# Altium footprint library PcbLib.PcbLib: 141 footprints (part 2 of 9)
Each footprint in its own frame and in the unit in brackets; x right, y up, seen from the top. Pads: shape width x height; smd on the part's side, far side on the other; paste and mask are expansions set on the pad; w line width, h text height; cw(c..) or ccw(c..) is an arc to the next point about the centre after c.
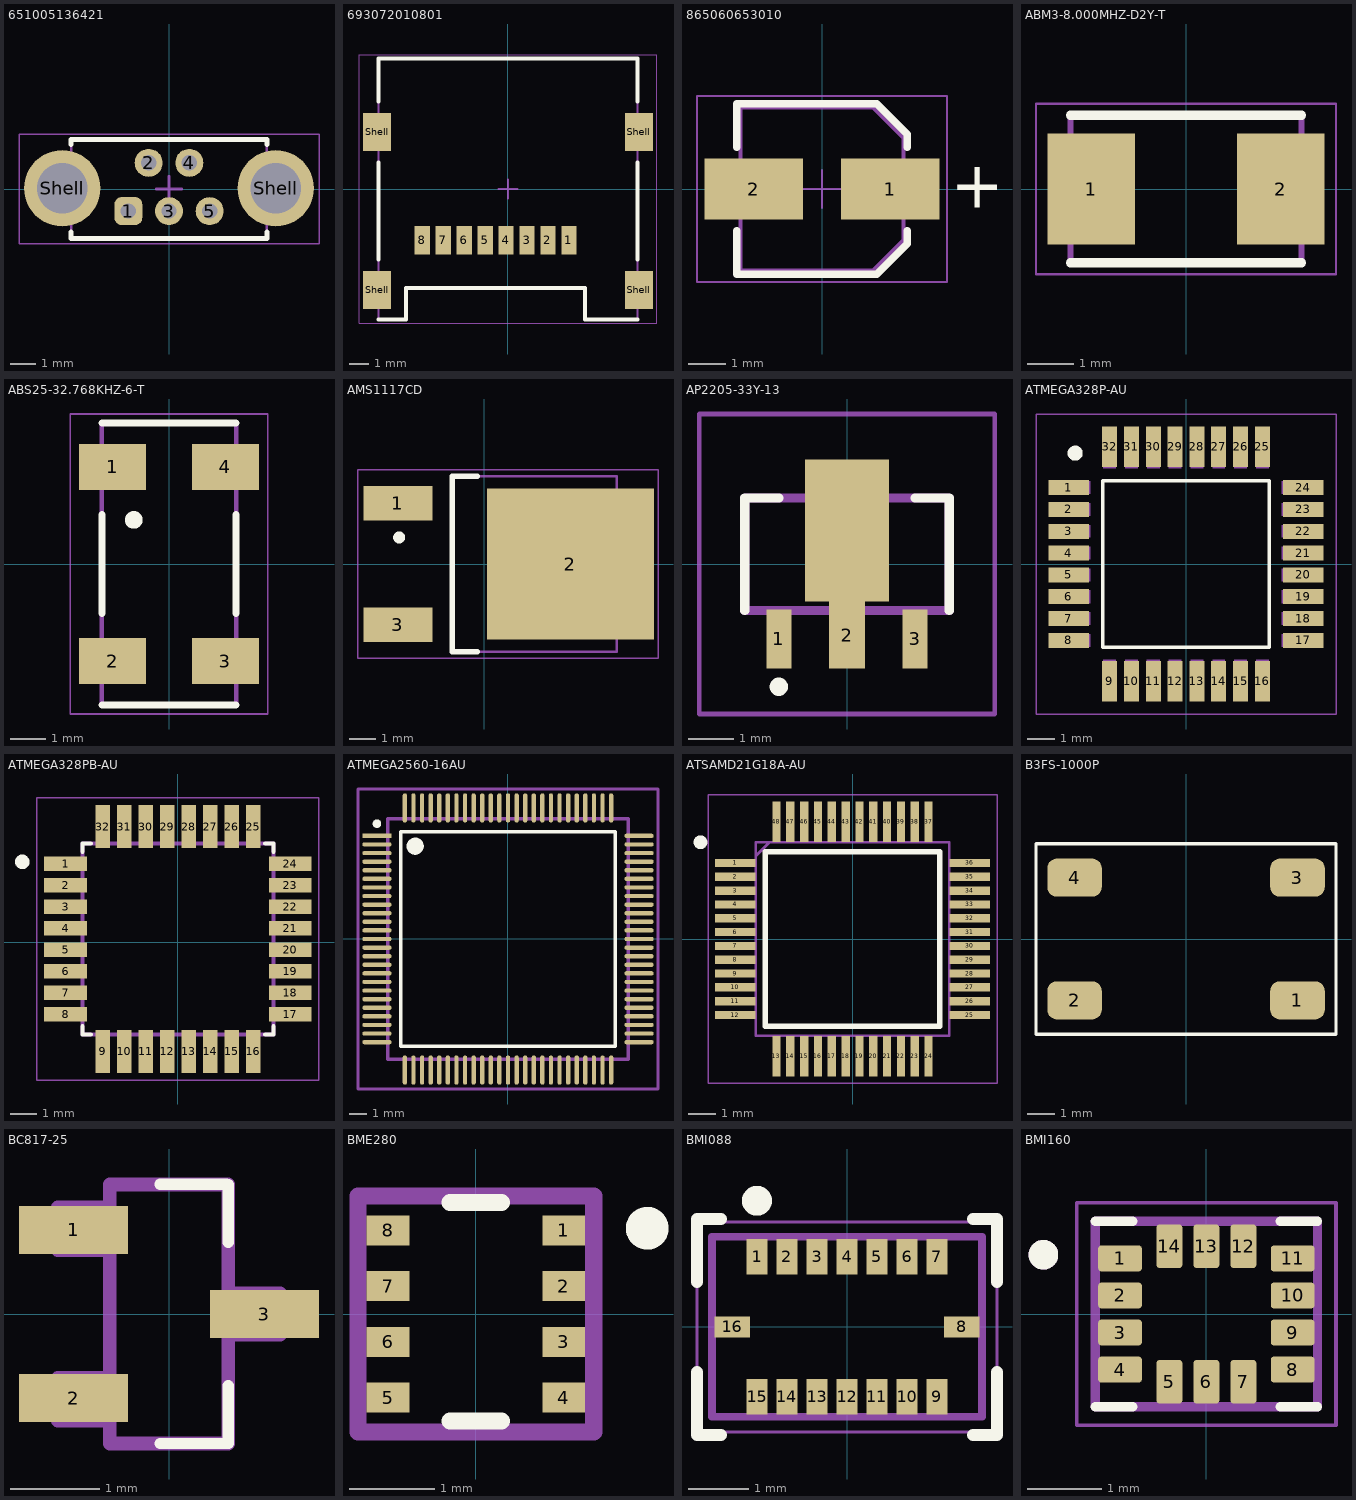
[diagram p1: the footprints below, top view; thin cyan lines are the x and y axes]

## 651005136421 [mm]
pads (7):
  rrect50% 1.1x1.1 hole 0.6: 1(-1.6,-0.87)
  round 1.1 hole 0.6: 2(-0.8,1.03) 3(0,-0.87) 4(0.8,1.03) 5(1.6,-0.87)
  round 3 hole 2: Shell(-4.2,0.03) Shell(4.2,0.03)
Top Overlay:
  lines w0.2: -3.85,-1.7 -3.85,-1.95 3.85,-1.95 3.85,-1.7 ; -3.85,1.75 -3.85,1.95 3.85,1.95 3.85,1.75
Top 3D Body:
  lines w0.1: -3.85,-1.95 -3.85,1.95 3.85,1.95 3.85,-1.95 -3.85,-1.95
Top Designator:
  text ".Designator" at -3.647,-0.357 h1
V Cut:
  lines w0.05: -5.9,-2.15 5.9,-2.15 5.9,2.15 -5.9,2.15 -5.9,-2.15
Top Assembly:
  lines w0.1: -3.85,-1.95 -3.85,1.95 3.85,1.95 3.85,-1.95 -3.85,-1.95
Top Component Center:
  lines w0.1: -0.5,0 0.5,0 ; 0,-0.5 0,0.5
3D body "651005136421.stp": height 9.4, standoff -2.6, extent -5.099,-1.92 5.098,1.98

## 693072010801 [mm]
pads (12):
  rect 0.8x1.5 smd: 1(3.2,-2.7) 2(2.1,-2.7) 3(1,-2.7) 4(-0.1,-2.7) 5(-1.2,-2.7) 6(-2.3,-2.7) 7(-3.4,-2.7) 8(-4.5,-2.7)
  rect 1.45x2 smd: Shell(-6.875,-5.3) Shell(-6.875,3) Shell(6.875,-5.3) Shell(6.875,3)
Top Overlay:
  lines w0.2: -6.8,-6.85 -5.35,-6.85 -5.35,-5.2 4.05,-5.2 4.05,-6.85 6.8,-6.85 ; -6.8,-3.7 -6.8,1.4 ; -6.8,4.6 -6.8,6.85 6.8,6.85 6.8,4.6 ; 6.8,-3.7 6.8,1.4
Top 3D Body:
  lines w0.1: -6.8,-6 -7.25,-6 -7.25,-4.6 -6.8,-4.6 ; -6.8,2.3 -7.25,2.3 -7.25,3.7 -6.8,3.7 ; 6.8,-6 7.25,-6 7.25,-4.6 6.8,-4.6 ; 6.8,2.3 7.25,2.3 7.25,3.7 6.8,3.7 ; -6.8,-6.85 -5.35,-6.85 -5.35,-5.2 4.05,-5.2 4.05,-6.85 6.8,-6.85 6.8,6.85 -6.8,6.85 -6.8,-6.85
Top Designator:
  text ".Designator" at -3.647,-0.357 h1
V Cut:
  lines w0.05: -7.8,-7.05 7.8,-7.05 7.8,7.05 -7.8,7.05 -7.8,-7.05
Top Assembly:
  lines w0.1: -6.8,-6 -7.25,-6 -7.25,-4.6 -6.8,-4.6 ; -6.8,2.3 -7.25,2.3 -7.25,3.7 -6.8,3.7 ; 6.8,-6 7.25,-6 7.25,-4.6 6.8,-4.6 ; 6.8,2.3 7.25,2.3 7.25,3.7 6.8,3.7 ; -6.8,-6.85 -6.8,6.85 6.8,6.85 6.8,-6.85 4.05,-6.85 4.05,-5.2 -5.35,-5.2 -5.35,-6.85 -6.8,-6.85
Top Component Center:
  lines w0.1: -0.5,0 0.5,0 ; 0,-0.5 0,0.5
3D body "693072010801.stp": height 1.79, standoff 0.02, extent -7.25,-6.85 7.25,6.85

## 865060653010 [mm]
pads (2):
  rect 2.6x1.6 smd: 1(1.8,0) 2(-1.8,0)
Top Overlay:
  lines w0.2: -2.25,-1.1 -2.25,-2.25 1.45,-2.25 2.25,-1.45 2.25,-1.1 ; -2.25,1.1 -2.25,2.25 1.45,2.25 2.25,1.45 2.25,1.1
  text "+" at 3.4,-0.5 h1.22
Top Courtyard:
  lines w0.05: -0.5,0 0.5,0 ; 0,-0.5 0,0.5 ; -3.3,-2.45 3.3,-2.45 3.3,2.45 -3.3,2.45 -3.3,-2.45
Top Component Outline:
  lines w0.1: -2.15,-2.15 1.35,-2.15 2.15,-1.35 2.15,1.35 1.35,2.15 -2.15,2.15 -2.15,-2.15
3D body "4x5.5x1.stp": height 5.5, standoff 0, extent -2.5,-2.15 2.5,2.15

## ABM3-8.000MHZ-D2Y-T [mm]
pads (2):
  rect 1.9x2.4 smd: 1(-2.05,0) 2(2.05,0)
Top Overlay:
  lines w0.2: -2.5,-1.6 2.5,-1.6 ; -2.5,1.6 2.5,1.6
Mechanical 13:
  lines w0.127: -2.5,-1.6 2.5,-1.6 2.5,1.6 -2.5,1.6 -2.5,-1.6
Mechanical 15:
  lines w0.05: -3.25,-1.85 3.25,-1.85 3.25,1.85 -3.25,1.85 -3.25,-1.85
3D body "step_temp.STEP": height 1.3, standoff 0, extent -2.5,-1.6 2.5,1.6

## ABS25-32.768KHZ-6-T [mm]
pads (4):
  rect 1.9x1.3 smd: 1(-1.6,2.75) 2(-1.6,-2.75) 3(1.6,-2.75) 4(1.6,2.75)
Top Overlay:
  circle w0.25: c-1,1.25 r0.125
  lines w0.2: -1.9,-4 1.9,-4 ; -1.9,-1.4 -1.9,1.4 ; -1.9,4 1.9,4 ; 1.9,-1.4 1.9,1.4
Mechanical 13:
  lines w0.127: -1.9,-4 1.9,-4 1.9,4 -1.9,4 -1.9,-4
Mechanical 15:
  lines w0.05: -2.8,-4.25 2.8,-4.25 2.8,4.25 -2.8,4.25 -2.8,-4.25
3D body "ABS25-32.768KHZ-6-T.STEP": height 2.75, standoff 0.09, extent -2.029,-4 1.971,4

## AMS1117CD [mm]
pads (3):
  rect 2.6x1.3 smd: 1(-3.25,2.28) 3(-3.25,-2.28)
  rect 6.3x5.7 smd: 2(3.25,0)
Top Overlay:
  circle w0.25: c-3.2,1 r0.1
  lines w0.2: -0.25,-3.3 -1.2,-3.3 -1.2,3.3 -0.25,3.3
Mechanical 13:
  lines w0.1: -1.2,-3.3 5,-3.3 5,3.3 -1.2,3.3 -1.2,-3.3
Mechanical 15:
  lines w0.05: -4.75,-3.55 6.55,-3.55 6.55,3.55 -4.75,3.55 -4.75,-3.55
  lines w0.1: 0.4,0 1.4,0 ; 0.9,-0.5 0.9,0.5
3D body "User Library-DPAK-1.STEP": height 2.34, standoff -0.07, extent -3.994,-3.25 5.944,3.29

## AP2205-33Y-13 [mm]
pads (4):
  rect 0.55x1.3 smd: 1(-1.5,-1.65) 3(1.5,-1.65)
  rect 0.8x1.475 smd: 2(0,-1.562)
  rect 1.85x3.125 smd: ""(0,0.737)
Top Overlay:
  lines w0.2: -2.25,-1.025 -2.25,1.45 -1.5,1.45 ; 1.5,1.45 2.25,1.45 2.25,-1.025 ; -1.5,-2.8 ccw(c-1.5,-2.7) -1.5,-2.6 ccw(c-1.5,-2.7) -1.5,-2.8
Mechanical 13:
  lines w0.2: -2.25,-1.025 -2.25,1.45 2.25,1.45 2.25,-1.025 -2.25,-1.025
Mechanical 15:
  lines w0.1: -3.25,-3.3 -3.25,3.3 3.25,3.3 3.25,-3.3 -3.25,-3.3
3D body "AP2205-33YR-13.STEP": height 1.6, standoff 0, extent -2.25,-1.975 2.25,2.125

## ATMEGA328P-AU [mm]
pads (32):
  rect 1.5x0.55 smd: 1(-4.3,2.8) 2(-4.3,2) 3(-4.3,1.2) 4(-4.3,0.4) 5(-4.3,-0.4) 6(-4.3,-1.2) 7(-4.3,-2) 8(-4.3,-2.8) 17(4.3,-2.8) 18(4.3,-2) 19(4.3,-1.2) 20(4.3,-0.4) 21(4.3,0.4) 22(4.3,1.2) 23(4.3,2) 24(4.3,2.8)
  rect 0.55x1.5 smd: 9(-2.8,-4.3) 10(-2,-4.3) 11(-1.2,-4.3) 12(-0.4,-4.3) 13(0.4,-4.3) 14(1.2,-4.3) 15(2,-4.3) 16(2.8,-4.3) 25(2.8,4.3) 26(2,4.3) 27(1.2,4.3) 28(0.4,4.3) 29(-0.4,4.3) 30(-1.2,4.3) 31(-2,4.3) 32(-2.8,4.3)
Top Overlay:
  circle w0.3: c-4.064,4.064 r0.127
  lines w0.127: -3.048,-3.048 -3.048,3.048 3.048,3.048 3.048,-3.048 -3.048,-3.048
Mechanical 13:
  region: -3.506,2.572 -4.497,2.572 -4.497,3.029 -3.506,3.029
  region: -3.506,1.775 -4.505,1.775 -4.505,2.229 -3.506,2.229
  region: -3.506,0.972 -4.5,0.972 -4.5,1.429 -3.506,1.429
  region: -3.506,0.172 -4.5,0.172 -4.5,0.629 -3.506,0.629
  region: -3.506,-0.629 -4.503,-0.629 -4.503,-0.171 -3.506,-0.171
  region: -3.506,-1.43 -4.502,-1.43 -4.502,-0.971 -3.506,-0.971
  region: -3.506,-2.231 -4.501,-2.231 -4.501,-1.771 -3.506,-1.771
  region: -3.506,-3.032 -4.501,-3.032 -4.501,-2.571 -3.506,-2.571
  region: -2.571,-4.505 -3.035,-4.505 -3.035,-3.506 -2.571,-3.506
  region: -1.771,-4.5 -2.23,-4.5 -2.23,-3.506 -1.771,-3.506
  region: -0.971,-4.504 -1.431,-4.504 -1.431,-3.506 -0.971,-3.506
  region: -0.171,-4.498 -0.629,-4.498 -0.629,-3.506 -0.171,-3.506
  region: 0.629,-4.502 0.172,-4.502 0.172,-3.506 0.629,-3.506
  region: 1.429,-4.498 0.972,-4.498 0.972,-3.506 1.429,-3.506
  region: 2.229,-4.504 1.774,-4.504 1.774,-3.506 2.229,-3.506
  region: 3.029,-4.503 2.575,-4.503 2.575,-3.506 3.029,-3.506
  region: 4.497,-3.029 3.507,-3.029 3.507,-2.571 4.497,-2.571
  region: 4.497,-2.233 3.513,-2.233 3.513,-1.771 4.497,-1.771
  region: 4.497,-1.431 3.511,-1.431 3.511,-0.971 4.497,-0.971
  region: 4.497,-0.629 3.509,-0.629 3.509,-0.171 4.497,-0.171
  region: 4.497,0.172 3.509,0.172 3.509,0.629 4.497,0.629
  region: 4.497,0.973 3.511,0.973 3.511,1.429 4.497,1.429
  region: 4.497,1.774 3.511,1.774 3.511,2.229 4.497,2.229
  region: 4.497,2.575 3.511,2.575 3.511,3.029 4.497,3.029
  region: 3.029,3.513 2.576,3.513 2.576,4.497 3.029,4.497
  region: 2.229,3.511 1.774,3.511 1.774,4.497 2.229,4.497
  region: 1.429,3.509 0.972,3.509 0.972,4.497 1.429,4.497
  region: 0.629,3.506 0.171,3.506 0.171,4.497 0.629,4.497
  region: -0.171,3.513 -0.63,3.513 -0.63,4.497 -0.171,4.497
  region: -0.971,3.508 -1.43,3.508 -1.43,4.497 -0.971,4.497
  region: -1.771,3.512 -2.233,3.512 -2.233,4.497 -1.771,4.497
  region: -2.571,3.509 -3.032,3.509 -3.032,4.497 -2.571,4.497
Mechanical 15:
  lines w0.05: -5.5,-5.5 5.5,-5.5 5.5,5.5 -5.5,5.5 -5.5,-5.5
3D body "ATMEGA328P-AU.stp": height 1.2, standoff 0, extent -4.5,-4.5 4.5,4.5

## ATMEGA328PB-AU [mm]
pads (32):
  rect 1.6x0.55 smd: 1(-4.18,2.927) 2(-4.18,2.127) 3(-4.18,1.327) 4(-4.18,0.527) 5(-4.18,-0.273) 6(-4.18,-1.073) 7(-4.18,-1.873) 8(-4.18,-2.673) 17(4.18,-2.673) 18(4.18,-1.873) 19(4.18,-1.073) 20(4.18,-0.273) 21(4.18,0.527) 22(4.18,1.327) 23(4.18,2.127) 24(4.18,2.927)
  rect 0.55x1.6 smd: 9(-2.8,-4.053) 10(-2,-4.053) 11(-1.2,-4.053) 12(-0.4,-4.053) 13(0.4,-4.053) 14(1.2,-4.053) 15(2,-4.053) 16(2.8,-4.053) 25(2.8,4.307) 26(2,4.307) 27(1.2,4.307) 28(0.4,4.307) 29(-0.4,4.307) 30(-1.2,4.307) 31(-2,4.307) 32(-2.8,4.307)
Top Overlay:
  circle w0.3: c-5.8,3 r0.12
  lines w0.152: -3.55,-3.123 -3.55,-3.423 -3.25,-3.423 ; -3.55,3.377 -3.55,3.677 -3.25,3.677 ; 3.25,-3.423 3.55,-3.423 3.55,-3.123 ; 3.25,3.677 3.55,3.677 3.55,3.377
Mechanical 13:
  lines w0.152: -3.55,-3.423 3.55,-3.423 3.55,3.677 -3.55,3.677 -3.55,-3.423
Mechanical 15:
  lines w0.05: -5.25,-5.123 5.25,-5.123 5.25,5.377 -5.25,5.377 -5.25,-5.123
3D body "step_temp.STEP": height 1.2, standoff 0, extent -4.5,-4.373 4.5,4.627

## ATMEGA2560-16AU [mm]
pads (100):
  rect 1.704x0.252 smd paste+0 mask+0: 1(-7.625,6)
  rrect100% 1.704x0.252 smd paste+0 mask+0: 2(-7.625,5.5) 3(-7.625,5) 4(-7.625,4.5) 5(-7.625,4) 6(-7.625,3.5) 7(-7.625,3) 8(-7.625,2.5) 9(-7.625,2) 10(-7.625,1.5) 11(-7.625,1) 12(-7.625,0.5) 13(-7.625,0) 14(-7.625,-0.5) 15(-7.625,-1) 16(-7.625,-1.5) 17(-7.625,-2) 18(-7.625,-2.5) 19(-7.625,-3) 20(-7.625,-3.5) 21(-7.625,-4) 22(-7.625,-4.5) 23(-7.625,-5) 24(-7.625,-5.5) 25(-7.625,-6) 51(7.625,-6) 52(7.625,-5.5) 53(7.625,-5) 54(7.625,-4.5) 55(7.625,-4) 56(7.625,-3.5) 57(7.625,-3) 58(7.625,-2.5) 59(7.625,-2) 60(7.625,-1.5) 61(7.625,-1) 62(7.625,-0.5) 63(7.625,0) 64(7.625,0.5) 65(7.625,1) 66(7.625,1.5) 67(7.625,2) 68(7.625,2.5) 69(7.625,3) 70(7.625,3.5) 71(7.625,4) 72(7.625,4.5) 73(7.625,5) 74(7.625,5.5) 75(7.625,6)
  rrect100% 0.252x1.704 smd paste+0 mask+0: 26(-6,-7.625) 27(-5.5,-7.625) 28(-5,-7.625) 29(-4.5,-7.625) 30(-4,-7.625) 31(-3.5,-7.625) 32(-3,-7.625) 33(-2.5,-7.625) 34(-2,-7.625) 35(-1.5,-7.625) 36(-1,-7.625) 37(-0.5,-7.625) 38(0,-7.625) 39(0.5,-7.625) 40(1,-7.625) 41(1.5,-7.625) 42(2,-7.625) 43(2.5,-7.625) 44(3,-7.625) 45(3.5,-7.625) 46(4,-7.625) 47(4.5,-7.625) 48(5,-7.625) 49(5.5,-7.625) 50(6,-7.625) 76(6,7.625) 77(5.5,7.625) 78(5,7.625) 79(4.5,7.625) 80(4,7.625) 81(3.5,7.625) 82(3,7.625) 83(2.5,7.625) 84(2,7.625) 85(1.5,7.625) 86(1,7.625) 87(0.5,7.625) 88(0,7.625) 89(-0.5,7.625) 90(-1,7.625) 91(-1.5,7.625) 92(-2,7.625) 93(-2.5,7.625) 94(-3,7.625) 95(-3.5,7.625) 96(-4,7.625) 97(-4.5,7.625) 98(-5,7.625) 99(-5.5,7.625) 100(-6,7.625)
Top Overlay:
  circle w0.25: c-7.625,6.71 r0.125
  circle w0.5: c-5.4,5.4 r0.25
  lines w0.2: -6.25,-6.25 6.25,-6.25 6.25,6.25 -6.25,6.25 -6.25,-6.25
Mechanical 12:
  lines w0.2: -7,-7 7,-7 7,7 -7,7 -7,-7
Mechanical 15:
  lines w0.2: -8.727,-8.727 8.727,-8.727 8.727,8.727 -8.727,8.727 -8.727,-8.727
3D body "ATMEGA2560-16AUR.STEP": height 1.2, standoff 0, extent -8,-8 8,8

## ATSAMD21G18A-AU [mm]
pads (48):
  rect 1.475x0.3 smd: 1(-4.238,2.75) 2(-4.238,2.25) 3(-4.238,1.75) 4(-4.238,1.25) 5(-4.238,0.75) 6(-4.238,0.25) 7(-4.238,-0.25) 8(-4.238,-0.75) 9(-4.238,-1.25) 10(-4.238,-1.75) 11(-4.238,-2.25) 12(-4.238,-2.75) 25(4.238,-2.75) 26(4.238,-2.25) 27(4.238,-1.75) 28(4.238,-1.25) 29(4.238,-0.75) 30(4.238,-0.25) 31(4.238,0.25) 32(4.238,0.75) 33(4.238,1.25) 34(4.238,1.75) 35(4.238,2.25) 36(4.238,2.75)
  rect 0.3x1.475 smd: 13(-2.75,-4.238) 14(-2.25,-4.238) 15(-1.75,-4.238) 16(-1.25,-4.238) 17(-0.75,-4.238) 18(-0.25,-4.238) 19(0.25,-4.238) 20(0.75,-4.238) 21(1.25,-4.238) 22(1.75,-4.238) 23(2.25,-4.238) 24(2.75,-4.238) 37(2.75,4.238) 38(2.25,4.238) 39(1.75,4.238) 40(1.25,4.238) 41(0.75,4.238) 42(0.25,4.238) 43(-0.25,4.238) 44(-0.75,4.238) 45(-1.25,4.238) 46(-1.75,4.238) 47(-2.25,4.238) 48(-2.75,4.238)
Top Overlay:
  circle w0.25: c-5.5,3.5 r0.125
  lines w0.2: -3.15,-3.15 -3.15,3.15 3.15,3.15 3.15,-3.15 -3.15,-3.15
Mechanical 15:
  lines w0.1: -3.5,3 -3,3.5 ; -3.5,-3.5 -3.5,3.5 3.5,3.5 3.5,-3.5 -3.5,-3.5
Mechanical 20:
  lines w0.05: -5.225,-5.225 -5.225,5.225 5.225,5.225 5.225,-5.225 -5.225,-5.225
3D body "ATSAMD21G18A-AU.stp": height 1.2, standoff 0, extent -4.5,-4.5 4.5,4.5

## B3FS-1000P [mm]
pads (4):
  rrect50% 2x1.4 smd: 1(4.088,-2.25) 2(-4.087,-2.25) 3(4.088,2.25) 4(-4.087,2.25)
Top Overlay:
  lines w0.127: -5.5,-3.5 -5.5,3.5 5.5,3.5 5.5,-3.5 -5.5,-3.5
3D body "B3FS-1000P.stp": height 3.11, standoff 0.01, extent -4,-3.25 4,3.25

## BC817-25 [mil]
pads (3):
  rect 48x21 smd: 1(-42,37) 2(-42,-37) 3(42,0)
Top Overlay:
  lines w5: -3.94,-57 26,-57 26,-31.5 ; -3.94,57.03 25.22,57.03 ; 26,31.5 26,57
Mechanical 13:
  lines w6: -26,-47 -26,-57 26,-57 26,-9 ; -26,-47 -26,-28 ; -26,-47 -49,-47 -49,-28 -26,-28 ; -26,-28 -26,28 ; -26,28 -26,47 ; -26,28 -49,28 -49,47 -26,47 ; -26,47 -26,57 -12,57 12,57 26,57 26,9 ; 26,-9 26,9 ; 26,-9 49,-9 49,9 26,9
3D body "bc817-25.stp": height 39.37, standoff 0, extent -47.24,-57.09 43.31,57.09

## BME280 [mm]
pads (8):
  rect 0.5x0.35 smd paste+0 mask+0: 1(1.025,0.975) 2(1.025,0.325) 3(1.025,-0.325) 4(1.025,-0.975) 5(-1.025,-0.975) 6(-1.025,-0.325) 7(-1.025,0.325) 8(-1.025,0.975)
Top Overlay:
  circle w0.25: c2,1 r0.125
  lines w0.2: -0.3,-1.25 0.3,-1.25 ; -0.3,1.3 0.3,1.3
Mechanical 10:
  lines w0.2: -1.375,-1.375 -1.375,1.375 1.375,1.375 1.375,-1.375 -1.375,-1.375
Mechanical 15:
  lines w0.2: -1.375,-1.375 -1.375,1.375 1.375,1.375 1.375,-1.375 -1.375,-1.375
3D body "BME280.stp": height 1, standoff 0, extent -1.25,-1.25 1.25,1.25

## BMI088 [mm]
pads (16):
  rect 0.35x0.59 smd: 1(-1.5,1.165) 2(-1,1.165) 3(-0.5,1.165) 4(0,1.165) 5(0.5,1.165) 6(1,1.165) 7(1.5,1.165) 9(1.5,-1.165) 10(1,-1.165) 11(0.5,-1.165) 12(0,-1.165) 13(-0.5,-1.165) 14(-1,-1.165) 15(-1.5,-1.165)
  rect 0.59x0.35 smd: 8(1.915,0) 16(-1.915,0)
Top Overlay:
  circle w0.25: c-1.5,2.1 r0.125
  lines w0.2: -2.5,-0.75 -2.5,-1.8 -2.1,-1.8 ; -2.5,0.75 -2.5,1.8 -2.1,1.8 ; 2.1,-1.8 2.5,-1.8 2.5,-0.75 ; 2.1,1.8 2.5,1.8 2.5,0.75
Mechanical 13:
  circle w0.2: c-1.5,2.1 r0.1
  lines w0.127: -2.25,-1.5 -2.25,1.5 2.25,1.5 2.25,-1.5 -2.25,-1.5
Mechanical 15:
  lines w0.05: -2.5,-1.75 -2.5,1.75 2.5,1.75 2.5,-1.75 -2.5,-1.75
3D body "BMI088.stp": height 1.55, standoff 0, extent -2.25,-1.5 2.25,1.5

## BMI160 [mm]
pads (14):
  rrect25% 0.59x0.35 smd: 1(-1.165,0.75) 2(-1.165,0.25) 3(-1.165,-0.25) 4(-1.165,-0.75) 8(1.165,-0.75) 9(1.165,-0.25) 10(1.165,0.25) 11(1.165,0.75)
  rrect25% 0.35x0.59 smd: 5(-0.5,-0.915) 6(0,-0.915) 7(0.5,-0.915) 12(0.5,0.915) 13(0,0.915) 14(-0.5,0.915)
Top Overlay:
  circle w0.2: c-2.2,0.8 r0.1
  lines w0.127: -1.5,-1.25 -0.995,-1.25 ; -1.5,1.25 -0.995,1.25 ; 0.995,-1.25 1.5,-1.25 ; 0.995,1.25 1.5,1.25
Mechanical 13:
  circle w0.2: c-2.2,0.8 r0.1
  lines w0.127: -1.5,-1.25 1.5,-1.25 1.5,1.25 -1.5,1.25 -1.5,-1.25
Mechanical 15:
  lines w0.05: -1.75,-1.5 1.75,-1.5 1.75,1.5 -1.75,1.5 -1.75,-1.5
3D body "BMI160.STEP": height 0.88, standoff 0, extent -1.5,-1.25 1.5,1.25